# Altium footprint library NXP_60_26022015.PCBLIB: 287 footprints (part 16 of 18)
Each footprint in its own frame and in the unit in brackets; x right, y up, seen from the top. Pads: shape width x height; smd on the part's side, far side on the other; paste and mask are expansions set on the pad; w line width, h text height; cw(c..) or ccw(c..) is an arc to the next point about the centre after c.
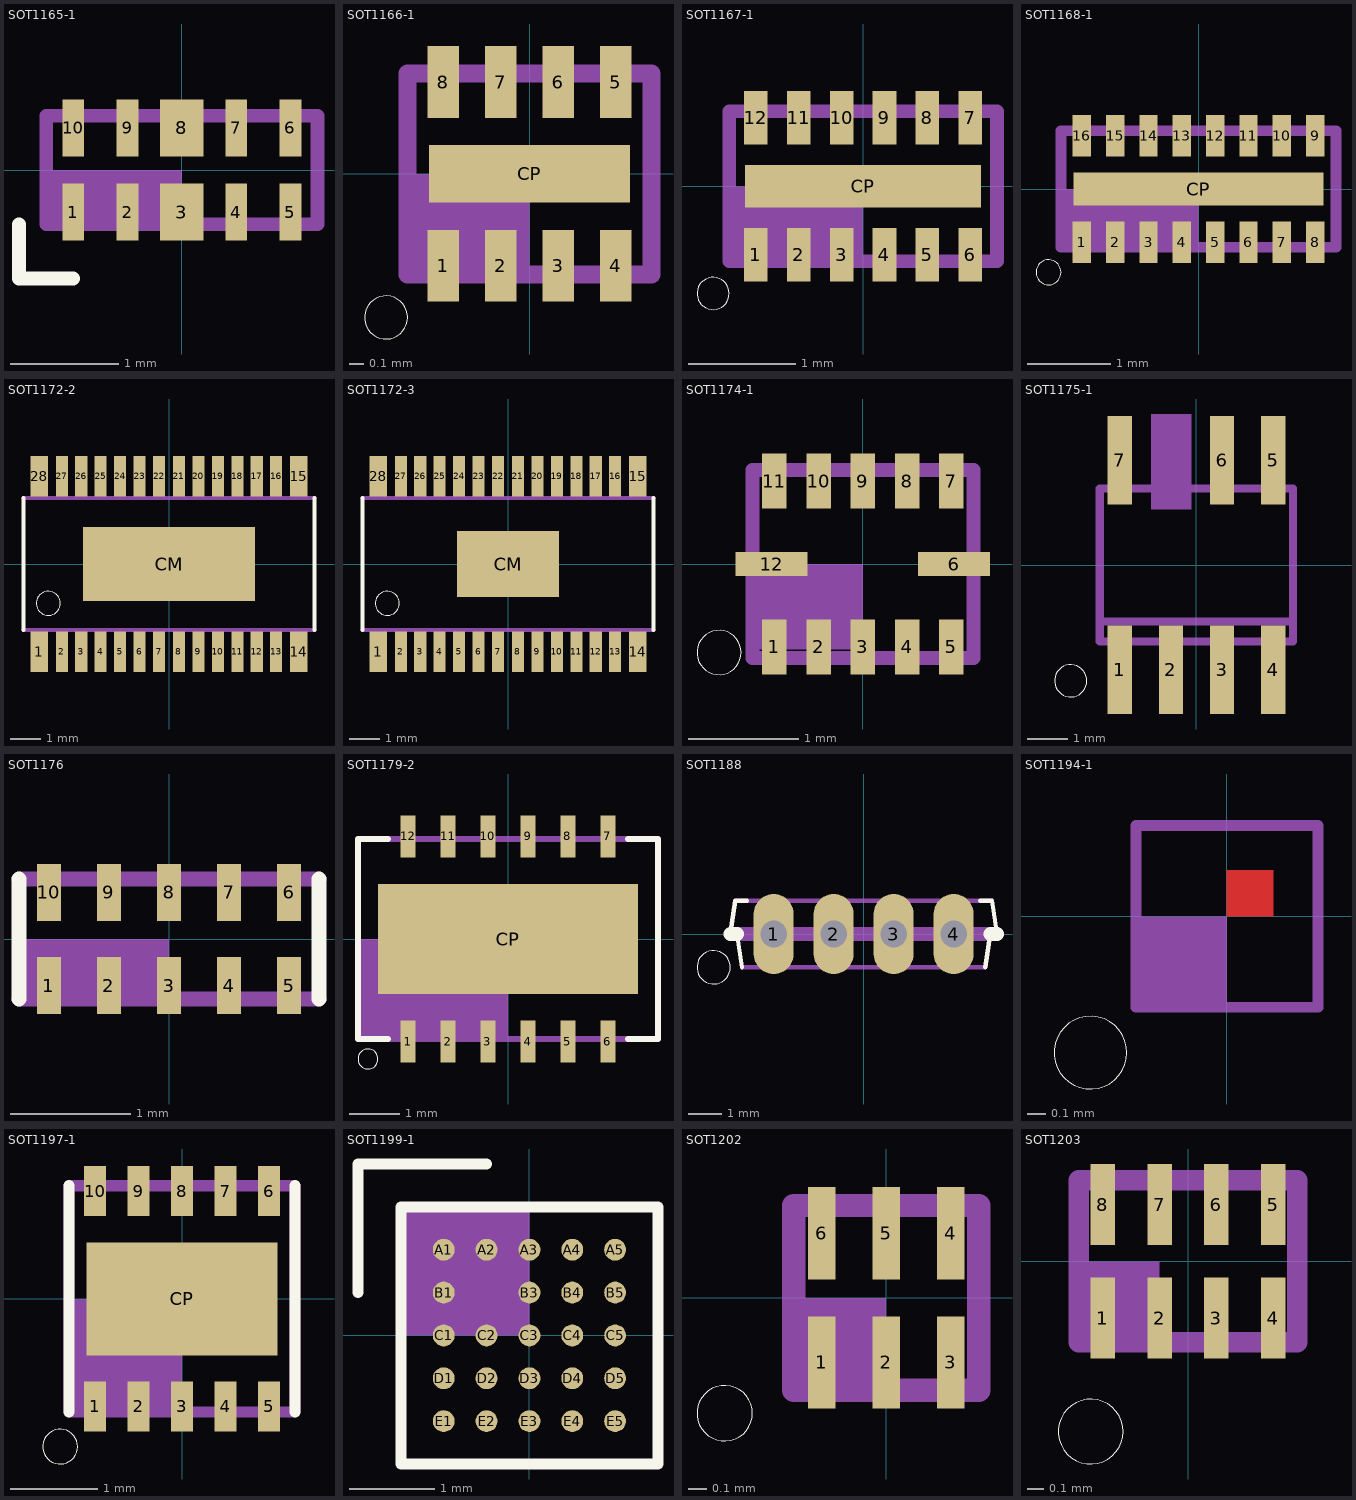
[diagram p15: the footprints below, top view; thin cyan lines are the x and y axes]

## SOT1165-1 [mm]
pads (10):
  rect 0.2x0.525 smd: 1(-1,-0.388) 2(-0.5,-0.388) 4(0.5,-0.388) 5(1,-0.388) 6(1,0.388) 7(0.5,0.388) 9(-0.5,0.388) 10(-1,0.388)
  rect 0.4x0.525 smd: 3(0,-0.388) 8(0,0.388)
Top Overlay:
  lines w0.127: -1.5,-0.5 -1.5,-1 -1,-1
Mechanical 16:
  rectangle: -1.25,-0.5 0,0
  lines w0.127: -1.25,-0.5 1.25,-0.5 1.25,0.5 -1.25,0.5 -1.25,-0.5
  text "SOT1165-1" at -0.625,-1 h0.17

## SOT1166-1 [mm]
pads (9):
  rect 0.22x0.5 smd: 1(-0.6,-0.64) 2(-0.2,-0.64) 3(0.2,-0.64) 4(0.6,-0.64) 5(0.6,0.64) 6(0.2,0.64) 7(-0.2,0.64) 8(-0.6,0.64)
  rect 1.4x0.4 smd: CP(0,0)
Top Overlay:
  circle w0: c-1,-1 r0.15
Top Paste:
  rectangle: -0.25,-0.15 0.25,0.15
Top Solder:
  rectangle: -0.76,-0.94 0.76,-0.34
  rectangle: -0.76,0.34 0.76,0.94
  rectangle: -0.75,-0.25 0.75,0.25
Mechanical 16:
  rectangle: -0.85,-0.7 0,0
  lines w0.127: -0.85,-0.7 -0.85,0.7 0.85,0.7 0.85,-0.7 -0.85,-0.7

## SOT1167-1 [mm]
pads (13):
  rect 0.22x0.5 smd: 1(-1,-0.64) 2(-0.6,-0.64) 3(-0.2,-0.64) 4(0.2,-0.64) 5(0.6,-0.64) 6(1,-0.64) 7(1,0.64) 8(0.6,0.64) 9(0.2,0.64) 10(-0.2,0.64) 11(-0.6,0.64) 12(-1,0.64)
  rect 2.2x0.4 smd: CP(0,0)
Top Overlay:
  circle w0: c-1.4,-1 r0.15
Top Paste:
  rectangle: -0.75,-0.15 -0.35,0.15
  rectangle: 0.35,-0.15 0.75,0.15
Top Solder:
  rectangle: -1.16,-0.94 1.16,-0.34
  rectangle: -1.16,0.34 1.16,0.94
  rectangle: -1.15,-0.25 1.15,0.25
Mechanical 16:
  rectangle: -1.25,-0.7 0,0
  lines w0.127: -1.25,-0.7 -1.25,0.7 1.25,0.7 1.25,-0.7 -1.25,-0.7

## SOT1168-1 [mm]
pads (17):
  rect 0.22x0.5 smd: 1(-1.4,-0.64) 2(-1,-0.64) 3(-0.6,-0.64) 4(-0.2,-0.64) 5(0.2,-0.64) 6(0.6,-0.64) 7(1,-0.64) 8(1.4,-0.64) 9(1.4,0.64) 10(1,0.64) 11(0.6,0.64) 12(0.2,0.64) 13(-0.2,0.64) 14(-0.6,0.64) 15(-1,0.64) 16(-1.4,0.64)
  rect 3x0.4 smd: CP(0,0)
Top Overlay:
  circle w0: c-1.8,-1 r0.15
Top Paste:
  rectangle: -0.175,-0.15 0.175,0.15
  rectangle: -1.175,-0.15 -0.825,0.15
  rectangle: 0.825,-0.15 1.175,0.15
Top Solder:
  rectangle: -1.56,-0.94 1.56,-0.34
  rectangle: -1.56,0.34 1.56,0.94
  rectangle: -1.55,-0.25 1.55,0.25
Mechanical 16:
  rectangle: -1.65,-0.7 0,0
  lines w0.127: -1.65,-0.7 -1.65,0.7 1.65,0.7 1.65,-0.7 -1.65,-0.7

## SOT1172-2 [mm]
pads (29):
  rect 0.6x1.35 smd: 1(-4.325,-2.925) 14(4.325,-2.925) 15(4.325,2.925) 28(-4.325,2.925)
  rect 0.4x1.35 smd: 2(-3.575,-2.925) 3(-2.925,-2.925) 4(-2.275,-2.925) 5(-1.625,-2.925) 6(-0.975,-2.925) 7(-0.325,-2.925) 8(0.325,-2.925) 9(0.975,-2.925) 10(1.625,-2.925) 11(2.275,-2.925) 12(2.925,-2.925) 13(3.575,-2.925) 16(3.575,2.925) 17(2.925,2.925) 18(2.275,2.925) 19(1.625,2.925) 20(0.975,2.925) 21(0.325,2.925) 22(-0.325,2.925) 23(-0.975,2.925) 24(-1.625,2.925) 25(-2.275,2.925) 26(-2.925,2.925) 27(-3.575,2.925)
  rect 5.75x2.45 smd: CM(0,0)
Top Overlay:
  circle w0: c-4.025,-1.31 r0.4
  lines w0.127: -4.85,-2.2 -4.85,2.2 ; 4.85,-2.2 4.85,2.2
Top Paste:
  rectangle: -0.35,-0.35 0.35,0.35
  rectangle: -0.35,0.463 0.35,1.163
  rectangle: -1.163,-0.35 -0.463,0.35
  rectangle: -1.975,-0.35 -1.275,0.35
  rectangle: -2.787,-0.35 -2.088,0.35
  rectangle: -1.163,0.463 -0.463,1.163
  rectangle: -1.975,0.463 -1.275,1.163
  rectangle: -2.787,0.463 -2.088,1.163
  rectangle: -2.787,-1.163 -2.088,-0.463
  rectangle: -1.975,-1.163 -1.275,-0.463
  rectangle: -1.163,-1.163 -0.463,-0.463
  rectangle: -0.35,-1.163 0.35,-0.463
  rectangle: 0.463,-1.163 1.163,-0.463
  rectangle: 1.275,-1.163 1.975,-0.463
  rectangle: 2.088,-1.163 2.787,-0.463
  rectangle: 2.088,-0.35 2.787,0.35
  rectangle: 2.088,0.463 2.787,1.163
  rectangle: 1.275,0.463 1.975,1.163
  rectangle: 0.463,0.463 1.163,1.163
  rectangle: 0.463,-0.35 1.163,0.35
  rectangle: 1.275,-0.35 1.975,0.35
Mechanical 16:
  rectangle: -0.45,2.2 -0.2,3.2
  rectangle: -1.1,2.2 -0.85,3.2
  rectangle: -1.75,2.2 -1.5,3.2
  rectangle: -2.4,2.2 -2.15,3.2
  rectangle: -3.05,2.2 -2.8,3.2
  rectangle: -3.7,2.2 -3.45,3.2
  rectangle: -4.35,2.2 -4.1,3.2
  rectangle: 0.2,2.2 0.45,3.2
  rectangle: 0.85,2.2 1.1,3.2
  rectangle: 1.5,2.2 1.75,3.2
  rectangle: 2.15,2.2 2.4,3.2
  rectangle: 2.8,2.2 3.05,3.2
  rectangle: 3.45,2.2 3.7,3.2
  rectangle: 4.1,2.2 4.35,3.2
  rectangle: -0.45,-3.2 -0.2,-2.2
  rectangle: -1.1,-3.2 -0.85,-2.2
  rectangle: -1.75,-3.2 -1.5,-2.2
  rectangle: -2.4,-3.2 -2.15,-2.2
  rectangle: -3.05,-3.2 -2.8,-2.2
  rectangle: -3.7,-3.2 -3.45,-2.2
  rectangle: -4.35,-3.2 -4.1,-2.2
  rectangle: 0.2,-3.2 0.45,-2.2
  rectangle: 0.85,-3.2 1.1,-2.2
  rectangle: 1.5,-3.2 1.75,-2.2
  rectangle: 2.15,-3.2 2.4,-2.2
  rectangle: 2.8,-3.2 3.05,-2.2
  rectangle: 3.45,-3.2 3.7,-2.2
  rectangle: 4.1,-3.2 4.35,-2.2
  lines w0.127: -4.85,-2.2 4.85,-2.2 ; -4.85,2.2 4.85,2.2

## SOT1172-3 [mm]
pads (29):
  rect 0.6x1.35 smd: 1(-4.325,-2.925) 14(4.325,-2.925) 15(4.325,2.925) 28(-4.325,2.925)
  rect 0.4x1.35 smd: 2(-3.575,-2.925) 3(-2.925,-2.925) 4(-2.275,-2.925) 5(-1.625,-2.925) 6(-0.975,-2.925) 7(-0.325,-2.925) 8(0.325,-2.925) 9(0.975,-2.925) 10(1.625,-2.925) 11(2.275,-2.925) 12(2.925,-2.925) 13(3.575,-2.925) 16(3.575,2.925) 17(2.925,2.925) 18(2.275,2.925) 19(1.625,2.925) 20(0.975,2.925) 21(0.325,2.925) 22(-0.325,2.925) 23(-0.975,2.925) 24(-1.625,2.925) 25(-2.275,2.925) 26(-2.925,2.925) 27(-3.575,2.925)
  rect 3.4x2.2 smd: CM(0,0)
Top Overlay:
  circle w0: c-4.025,-1.31 r0.4
  lines w0.127: -4.85,-2.2 -4.85,2.2 ; 4.85,-2.2 4.85,2.2
Top Paste:
  rectangle: 0.06,-0.3 0.76,0.3
  rectangle: -0.76,-0.3 -0.06,0.3
  rectangle: 0.06,0.4 0.76,1
  rectangle: -0.76,0.4 -0.06,1
  rectangle: -0.76,-1 -0.06,-0.4
  rectangle: 0.06,-1 0.76,-0.4
  rectangle: 0.88,0.4 1.58,1
  rectangle: 0.88,-0.3 1.58,0.3
  rectangle: 0.88,-1 1.58,-0.4
  rectangle: -1.58,0.4 -0.88,1
  rectangle: -1.58,-0.3 -0.88,0.3
  rectangle: -1.58,-1 -0.88,-0.4
Mechanical 16:
  rectangle: -0.45,2.2 -0.2,3.2
  rectangle: -1.1,2.2 -0.85,3.2
  rectangle: -1.75,2.2 -1.5,3.2
  rectangle: -2.4,2.2 -2.15,3.2
  rectangle: -3.05,2.2 -2.8,3.2
  rectangle: -3.7,2.2 -3.45,3.2
  rectangle: -4.35,2.2 -4.1,3.2
  rectangle: 0.2,2.2 0.45,3.2
  rectangle: 0.85,2.2 1.1,3.2
  rectangle: 1.5,2.2 1.75,3.2
  rectangle: 2.15,2.2 2.4,3.2
  rectangle: 2.8,2.2 3.05,3.2
  rectangle: 3.45,2.2 3.7,3.2
  rectangle: 4.1,2.2 4.35,3.2
  rectangle: -0.45,-3.2 -0.2,-2.2
  rectangle: -1.1,-3.2 -0.85,-2.2
  rectangle: -1.75,-3.2 -1.5,-2.2
  rectangle: -2.4,-3.2 -2.15,-2.2
  rectangle: -3.05,-3.2 -2.8,-2.2
  rectangle: -3.7,-3.2 -3.45,-2.2
  rectangle: -4.35,-3.2 -4.1,-2.2
  rectangle: 0.2,-3.2 0.45,-2.2
  rectangle: 0.85,-3.2 1.1,-2.2
  rectangle: 1.5,-3.2 1.75,-2.2
  rectangle: 2.15,-3.2 2.4,-2.2
  rectangle: 2.8,-3.2 3.05,-2.2
  rectangle: 3.45,-3.2 3.7,-2.2
  rectangle: 4.1,-3.2 4.35,-2.2
  lines w0.127: -4.85,-2.2 4.85,-2.2 ; -4.85,2.2 4.85,2.2

## SOT1174-1 [mm]
pads (12):
  rect 0.22x0.5 smd: 1(-0.8,-0.75) 2(-0.4,-0.75) 3(0,-0.75) 4(0.4,-0.75) 5(0.8,-0.75) 7(0.8,0.75) 8(0.4,0.75) 9(0,0.75) 10(-0.4,0.75) 11(-0.8,0.75)
  rect 0.65x0.22 smd: 6(0.825,0) 12(-0.825,0)
Top Overlay:
  circle w0: c-1.3,-0.8 r0.2
Top Paste:
  rectangle: -0.085,-0.975 0.085,-0.525
  rectangle: -0.485,-0.975 -0.315,-0.525
  rectangle: -0.885,-0.975 -0.715,-0.525
  rectangle: 0.315,-0.975 0.485,-0.525
  rectangle: 0.715,-0.975 0.885,-0.525
  rectangle: -0.085,0.525 0.085,0.975
  rectangle: -0.485,0.525 -0.315,0.975
  rectangle: -0.885,0.525 -0.715,0.975
  rectangle: 0.315,0.525 0.485,0.975
  rectangle: 0.715,0.525 0.885,0.975
  rectangle: 0.525,-0.085 1.125,0.085
  rectangle: -1.125,-0.085 -0.525,0.085
Top Solder:
  rectangle: -0.172,-1.062 0.172,-0.437
  rectangle: -0.573,-1.062 -0.228,-0.437
  rectangle: -0.973,-1.062 -0.627,-0.437
  rectangle: 0.228,-1.062 0.573,-0.437
  rectangle: 0.627,-1.062 0.973,-0.437
  rectangle: -0.172,0.437 0.172,1.062
  rectangle: -0.573,0.437 -0.228,1.062
  rectangle: -0.973,0.437 -0.627,1.062
  rectangle: 0.228,0.437 0.573,1.062
  rectangle: 0.627,0.437 0.973,1.062
  rectangle: 0.437,-0.172 1.213,0.172
  rectangle: -1.213,-0.172 -0.437,0.172
Mechanical 16:
  rectangle: -1,-0.775 0,0
  lines w0.127: -1,-0.85 1,-0.85 1,0.85 -1,0.85 -1,-0.85
  text "SOT1174-1" at -0.8,0.4 h0.17

## SOT1175-1 [mm]
pads (7):
  rect 0.6x2.2 smd: 1(-1.905,-2.6) 2(-0.635,-2.6) 3(0.635,-2.6) 4(1.905,-2.6) 5(1.905,2.6) 6(0.635,2.6) 7(-1.905,2.6)
Top Overlay:
  circle w0: c-3.125,-2.875 r0.4
Mechanical 11:
  rectangle: -1.125,1.375 -0.125,3.75
Mechanical 16:
  rectangle: -2.15,-3.1 -1.66,-2
  rectangle: -0.88,-3.1 -0.39,-2
  rectangle: 0.39,-3.1 0.88,-2
  rectangle: 1.66,-3.1 2.15,-2
  rectangle: 1.66,2 2.15,3.1
  rectangle: 0.39,2 0.88,3.1
  rectangle: -2.15,2 -1.66,3.1
  lines w0.203: -2.4,-1.4 -2.4,-1.9 2.4,-1.9 2.4,-1.4 ; -2.4,-1.4 -2.4,1.9 2.4,1.9 2.4,-1.4 ; -2.4,-1.4 2.4,-1.4
  text "SOT1175-1" at -0.875,-1 h0.17

## SOT1176 [mm]
pads (10):
  rect 0.2x0.475 smd: 1(-1,-0.388) 2(-0.5,-0.388) 3(0,-0.388) 4(0.5,-0.388) 5(1,-0.388) 6(1,0.388) 7(0.5,0.388) 8(0,0.388) 9(-0.5,0.388) 10(-1,0.388)
Top Overlay:
  lines w0.127: -1.25,-0.5 -1.25,0.5 ; 1.25,-0.5 1.25,0.5
Top Solder:
  rectangle: -0.15,0.1 0.15,0.675
  rectangle: -0.65,0.1 -0.35,0.675
  rectangle: -1.15,0.1 -0.85,0.675
  rectangle: 0.35,0.1 0.65,0.675
  rectangle: 0.85,0.1 1.15,0.675
  rectangle: -0.15,-0.675 0.15,-0.1
  rectangle: -0.65,-0.675 -0.35,-0.1
  rectangle: -1.15,-0.675 -0.85,-0.1
  rectangle: 0.35,-0.675 0.65,-0.1
  rectangle: 0.85,-0.675 1.15,-0.1
Mechanical 16:
  rectangle: -1.25,-0.5 0,0
  lines w0.127: -1.25,-0.5 1.25,-0.5 ; -1.25,0.5 1.25,0.5

## SOT1179-2 [mm]
pads (13):
  rect 0.3x0.85 smd: 1(-2,-2.05) 2(-1.2,-2.05) 3(-0.4,-2.05) 4(0.4,-2.05) 5(1.2,-2.05) 6(2,-2.05) 7(2,2.05) 8(1.2,2.05) 9(0.4,2.05) 10(-0.4,2.05) 11(-1.2,2.05) 12(-2,2.05)
  rect 5.2x2.2 smd: CP(0,0)
Top Overlay:
  circle w0: c-2.8,-2.4 r0.2
  lines w0.127: -2.4,-2 -3,-2 -3,2 -2.4,2 ; 2.4,-2 3,-2 3,2 2.4,2
Top Paste:
  rectangle: 0.65,-0.45 1.75,0.45
  rectangle: -1.75,-0.45 -0.65,0.45
Mechanical 16:
  rectangle: -3,-2 0,0
  lines w0.127: -3,-2 -3,2 3,2 3,-2 -3,-2

## SOT1188 [mil]
pads (4):
  oval 47.25x94.5 hole 31.5: 1(-106.3,0) 2(-35.43,0) 3(35.43,0) 4(106.3,0)
Top Overlay:
  circle w0: c-177.17,-39.37 r19.69
  lines w5: -157.48,0 -151.57,39.37 -137.8,39.37 ; -149.61,0 -143.7,-39.37 ; 137.8,39.37 151.57,39.37 157.48,0 ; 143.7,-39.37 149.61,0
  lines w16: -157.48,0 -149.61,0 ; 149.61,0 157.48,0
Mechanical 16:
  lines w5: -151.57,39.37 151.57,39.37 ; -143.7,-39.37 143.7,-39.37
  lines w16: -149.61,0 149.61,0
  text "SOT1188" at 83.66,-68.9 h6.69

## SOT1194-1 [mm]
pads (5):
  rect 0x0 smd: 1(-0.325,-0.45) 2(0.325,-0.45) 3(0.425,0.45) 4(-0.325,0.45) CP(0,0)
Top Layer:
  region: 0,0 0.254,0 0.254,0.254 0,0.254
  region: 0,0 0.254,0 0.254,0.254 0,0.254
  region: 0,0 0.254,0 0.254,0.254 0,0.254
  region: 0,0 0.254,0 0.254,0.254 0,0.254
  region: 0,0 0.254,0 0.254,0.254 0,0.254
Top Overlay:
  circle w0: c-0.75,-0.75 r0.2
Top Paste:
  region: 0,0 0.254,0 0.254,0.254 0,0.254
  region: 0,0 0.254,0 0.254,0.254 0,0.254
  region: 0,0 0.254,0 0.254,0.254 0,0.254
  region: 0,0 0.254,0 0.254,0.254 0,0.254
  region: 0,0 0.254,0 0.254,0.254 0,0.254
Top Solder:
  rectangle: -0.5,-0.7 0.5,0.7
Mechanical 16:
  rectangle: -0.5,-0.5 0,0
  lines w0.06: -0.5,-0.5 0.5,-0.5 0.5,0.5 -0.5,0.5 -0.5,-0.5

## SOT1197-1 [mm]
pads (11):
  rect 0.25x0.575 smd: 1(-1,-1.237) 2(-0.5,-1.237) 3(0,-1.237) 4(0.5,-1.237) 5(1,-1.237) 6(1,1.237) 7(0.5,1.237) 8(0,1.237) 9(-0.5,1.237) 10(-1,1.237)
  rect 2.2x1.3 smd: CP(0,0)
Top Overlay:
  circle w0: c-1.4,-1.7 r0.2
  lines w0.127: -1.3,-1.3 -1.3,1.3 ; 1.3,-1.3 1.3,1.3
Top Paste:
  rectangle: -0.4,-0.2 0.4,0.2
Top Solder:
  rectangle: -1.15,0.925 1.15,1.55
  rectangle: -1.15,-1.55 1.15,-0.925
  rectangle: -1.125,-0.675 1.125,0.675
Mechanical 16:
  rectangle: -1.3,-1.3 0,0
  lines w0.127: -1.3,-1.3 -1.3,1.3 1.3,1.3 1.3,-1.3 -1.3,-1.3

## SOT1199-1 [mm]
pads (24):
  rrect100% 0.255x0.255 smd: A1(-1,1) A2(-0.5,1) A3(0,1) A4(0.5,1) A5(1,1) B1(-1,0.5) B3(0,0.5) B4(0.5,0.5) B5(1,0.5) C1(-1,0) C2(-0.5,0) C3(0,0) C4(0.5,0) C5(1,0) D1(-1,-0.5) D2(-0.5,-0.5) D3(0,-0.5) D4(0.5,-0.5) D5(1,-0.5) E1(-1,-1) E2(-0.5,-1) E3(0,-1) E4(0.5,-1) E5(1,-1)
Top Overlay:
  lines w0.127: -2,0.5 -2,2 -0.5,2 ; -1.5,-1.5 1.5,-1.5 1.5,1.5 -1.5,1.5 -1.5,-1.5
Mechanical 16:
  rectangle: -1.5,0 0,1.5

## SOT1202 [mm]
pads (6):
  rect 0.15x0.5 smd: 1(-0.35,-0.35) 2(0,-0.35) 3(0.35,-0.35) 4(0.35,0.35) 5(0,0.35) 6(-0.35,0.35)
Top Overlay:
  circle w0: c-0.875,-0.625 r0.15
Mechanical 16:
  rectangle: -0.5,-0.5 0,0
  lines w0.127: -0.5,-0.5 0.5,-0.5 0.5,0.5 -0.5,0.5 -0.5,-0.5
  text "SOT1202" at -0.75,-1.125 h0.17

## SOT1203 [mm]
pads (8):
  rect 0.15x0.5 smd: 1(-0.525,-0.35) 2(-0.175,-0.35) 3(0.175,-0.35) 4(0.525,-0.35) 5(0.525,0.35) 6(0.175,0.35) 7(-0.175,0.35) 8(-0.525,0.35)
Top Overlay:
  circle w0: c-0.6,-1.05 r0.2
Mechanical 16:
  rectangle: -0.675,-0.5 -0.175,0
  lines w0.127: -0.675,-0.5 0.675,-0.5 0.675,0.5 -0.675,0.5 -0.675,-0.5
  text "SOT1203" at -0.575,0.8 h0.17